# Altium footprint library LION.PcbLib: 90 footprints (part 4 of 13) (continued)
## CSG324 [mil] "CSG324" (continued)
via 31.49,314.95 diameter 18 hole 10
via 62.98,220.46 diameter 18 hole 10
via 31.49,220.46 diameter 18 hole 10
via -0.01,283.46 diameter 18 hole 10
via 31.49,188.97 diameter 18 hole 10
via 157.47,188.97 diameter 18 hole 10
via -251.96,-125.98 diameter 18 hole 10
via -220.46,-94.48 diameter 18 hole 10
via -283.46,-125.98 diameter 18 hole 10
via 220.46,125.98 diameter 18 hole 10
via 220.46,62.98 diameter 18 hole 10
via 220.46,220.46 diameter 18 hole 10
via 251.97,94.49 diameter 18 hole 10
via 94.49,251.97 diameter 18 hole 10
via 220.46,283.46 diameter 18 hole 10
via 188.97,283.46 diameter 18 hole 10
via 157.47,-125.98 diameter 18 hole 10
via 314.95,-220.46 diameter 18 hole 10
via -94.48,157.47 diameter 18 hole 10
via 220.46,-251.96 diameter 18 hole 10
via 62.98,-251.96 diameter 18 hole 10
via 31.49,-220.46 diameter 18 hole 10
via 62.98,-220.46 diameter 18 hole 10
via -220.46,-31.49 diameter 18 hole 10
via 125.98,-220.46 diameter 18 hole 10
via 157.47,-251.96 diameter 18 hole 10
via -283.47,-94.49 diameter 18 hole 10
via -283.46,-62.98 diameter 18 hole 10
via -62.98,188.97 diameter 18 hole 10
via -283.46,-31.49 diameter 18 hole 10
via -125.98,283.46 diameter 18 hole 10
via -94.48,220.46 diameter 18 hole 10
via 157.47,-220.46 diameter 18 hole 10
via 251.96,-157.47 diameter 18 hole 10
via 188.97,-188.97 diameter 18 hole 10
via 188.97,-157.47 diameter 18 hole 10
via 188.97,-283.46 diameter 18 hole 10
via 220.46,-220.46 diameter 18 hole 10
via 188.97,-220.46 diameter 18 hole 10
via 314.96,-251.97 diameter 18 hole 10
via 251.97,-283.47 diameter 18 hole 10
via 157.47,62.98 diameter 18 hole 10
via 94.48,220.46 diameter 18 hole 10
via -157.47,157.47 diameter 18 hole 10
via 188.97,125.98 diameter 18 hole 10
via -94.48,-188.97 diameter 18 hole 10
via 188.97,220.46 diameter 18 hole 10
via 62.98,251.96 diameter 18 hole 10
via 220.46,251.96 diameter 18 hole 10
via -94.48,188.97 diameter 18 hole 10
via -157.47,283.46 diameter 18 hole 10
via -125.98,251.96 diameter 18 hole 10
via -125.98,220.46 diameter 18 hole 10
via -125.98,157.47 diameter 18 hole 10
via -0.01,-188.97 diameter 18 hole 10
via 94.48,-220.46 diameter 18 hole 10
via 188.97,-251.96 diameter 18 hole 10
via 283.47,-283.47 diameter 18 hole 10
via -62.98,-157.47 diameter 18 hole 10
via 251.96,-62.98 diameter 18 hole 10
via 220.46,-157.47 diameter 18 hole 10
via 157.47,-31.49 diameter 18 hole 10
via 283.46,62.98 diameter 18 hole 10
via 188.97,94.48 diameter 18 hole 10
via 125.98,-125.98 diameter 18 hole 10
via 125.98,220.46 diameter 18 hole 10
via 220.46,188.97 diameter 18 hole 10
via 251.97,283.47 diameter 18 hole 10
via 31.49,251.96 diameter 18 hole 10
via 31.49,-251.96 diameter 18 hole 10
via -220.46,-283.46 diameter 18 hole 10
via -220.46,62.98 diameter 18 hole 10
via -94.48,62.98 diameter 18 hole 10
via -125.98,31.49 diameter 18 hole 10
via -0.01,31.49 diameter 18 hole 10
via -62.98,31.49 diameter 18 hole 10
via -94.48,-31.49 diameter 18 hole 10
via -251.96,-62.98 diameter 18 hole 10
via -157.47,-94.48 diameter 18 hole 10
via -283.46,-157.47 diameter 18 hole 10
via 31.49,-62.98 diameter 18 hole 10
via 31.49,-125.98 diameter 18 hole 10
via -0.01,-62.98 diameter 18 hole 10
via -62.98,-62.98 diameter 18 hole 10
via -62.98,-125.98 diameter 18 hole 10
via -94.49,-94.49 diameter 18 hole 10
via -94.48,-220.46 diameter 18 hole 10
via -188.97,-188.97 diameter 18 hole 10
via -0.01,62.98 diameter 18 hole 10
via -62.98,94.48 diameter 18 hole 10
via 157.47,-188.97 diameter 18 hole 10
via 94.48,-125.98 diameter 18 hole 10
via 62.98,62.98 diameter 18 hole 10
via 125.98,62.98 diameter 18 hole 10
via 94.48,31.49 diameter 18 hole 10
via 220.46,31.49 diameter 18 hole 10
via 62.98,-31.49 diameter 18 hole 10
via 94.48,-62.98 diameter 18 hole 10
via 188.97,-94.48 diameter 18 hole 10
via 283.46,-125.98 diameter 18 hole 10
via 251.96,-220.46 diameter 18 hole 10
via -188.97,157.47 diameter 18 hole 10
via -0.01,125.98 diameter 18 hole 10
via -62.98,157.47 diameter 18 hole 10
via -62.98,220.46 diameter 18 hole 10
via -94.48,125.98 diameter 18 hole 10
via -157.47,251.96 diameter 18 hole 10
via -251.97,283.47 diameter 18 hole 10
via -283.46,188.97 diameter 18 hole 10
via 251.96,125.98 diameter 18 hole 10
via 283.46,220.46 diameter 18 hole 10
via 157.47,157.47 diameter 18 hole 10
via 188.97,251.96 diameter 18 hole 10
via 94.49,283.47 diameter 18 hole 10
via 62.98,188.97 diameter 18 hole 10
via 62.98,125.98 diameter 18 hole 10
Top Layer:
  lines w5: -15.75,-267.72 -0.01,-283.46 ; -15.75,-236.22 -0.01,-251.96 ; 267.72,-236.22 299.21,-236.22 314.96,-251.97 ; 267.72,-204.72 299.21,-204.72 314.95,-220.46
  lines w6: -283.46,-220.46 -267.72,-204.72 ; -283.46,-188.97 -267.72,-173.23 ; -283.46,-125.98 -267.72,-110.24 ; -283.47,-94.49 -267.72,-78.74 ; -283.46,-62.98 -267.72,-47.24 ; -283.46,-31.49 -267.72,-15.75 ; -283.46,62.98 -267.72,47.24 ; -283.47,94.49 -267.72,78.74 ; -283.46,125.98 -267.72,110.24 ; -283.46,157.47 -267.72,141.73 ; -283.46,220.46 -267.72,204.72 ; -251.96,-188.97 -236.22,-173.23 ; -251.96,-125.98 -236.22,-110.24 ; -251.97,-94.49 -236.22,-78.74 ; -251.96,-31.49 -236.22,-15.75 ; -251.96,31.49 -236.22,15.75 ; -251.96,62.98 -236.22,47.24 ; -251.97,94.49 -236.22,78.74 ; -251.96,220.46 -236.22,204.72 ; -220.46,-220.46 -204.72,-204.72 ; -220.46,-188.97 -204.72,-173.23 ; -220.46,-94.48 -204.72,-78.74 ; -220.46,-31.49 -204.72,-15.75 ; -220.46,31.49 -204.72,15.75 ; -220.46,94.48 -204.72,78.74 ; -188.97,-125.98 -173.23,-110.24 ; -188.97,-94.48 -173.23,-78.74 ; -188.97,-62.98 -173.23,-47.24 ; -188.97,31.49 -173.23,15.75 ; -188.97,62.98 -173.23,47.24 ; -188.97,94.48 -173.23,78.74 ; -188.97,251.97 -188.97,251.98 -173.23,267.72 ; -157.47,-188.97 -141.73,-173.23 ; -157.47,-31.49 -141.73,-15.75 ; -157.47,62.98 -141.73,47.24 ; -157.47,157.47 -141.73,141.73 ; -157.47,283.46 -141.73,267.72 ; -125.98,-283.46 -110.24,-267.72 ; -125.98,-251.96 -110.24,-236.22 ; -125.98,-220.46 -110.24,-204.72 ; -125.98,-188.97 -110.24,-173.23 ; -125.98,-125.98 -110.24,-110.24 ; -125.98,-94.48 -110.24,-78.74 ; -125.98,62.98 -110.24,47.24 ; -125.98,94.48 -110.24,78.74 ; -125.98,125.98 -110.24,110.24 ; -125.98,157.47 -110.24,141.73 ; -125.98,220.46 -110.24,204.72 ; -125.98,251.96 -110.24,236.22 ; -125.98,283.46 -110.24,267.72 ; -94.49,-283.47 -78.74,-267.72 ; -94.49,-251.97 -78.74,-236.22 ; -94.48,-188.97 -78.74,-173.23 ; -94.48,-157.47 -78.74,-141.73 ; -94.48,157.47 -78.74,141.73 ; -94.48,188.97 -78.74,173.23 ; -94.48,220.46 -78.74,204.72 ; -94.49,251.97 -78.74,236.22 ; -62.98,-251.96 -47.24,-236.22 ; -62.98,-220.46 -47.24,-204.72 ; -62.98,-188.97 -47.24,-173.23 ; -62.98,188.97 -47.24,173.23 ; -15.75,-141.73 -0.01,-157.47 ; -15.75,-15.75 -0.01,-31.49 ; -15.75,141.73 -0.01,157.47 ; -15.75,173.23 -0.01,188.97 ; -15.75,204.72 -0.01,220.46 ; -15.75,267.72 -0.01,283.46 ; 15.75,-204.72 31.49,-220.46 ; 15.75,-141.73 31.49,-157.47 ; 15.75,-15.75 31.49,-31.49 ; 15.75,15.75 31.49,31.49 ; 15.75,110.24 31.49,125.98 ; 15.75,141.73 31.49,157.47 ; 15.75,173.23 31.49,188.97 ; 15.75,204.72 31.49,220.46 ; 15.75,267.72 31.49,283.46 31.49,314.95 ; 47.24,-236.22 62.98,-251.96 ; 47.24,-204.72 62.98,-220.46 ; 47.24,-141.73 62.98,-157.47 ; 47.24,78.74 62.98,94.48 ; 47.24,141.73 62.98,157.47 ; 47.24,204.72 62.98,220.46 ; 47.24,236.22 62.98,251.96 ; 47.24,267.72 62.98,283.46 ; 78.74,-141.73 94.48,-157.47 ; 78.74,141.73 94.48,157.47 ; 78.74,173.23 94.48,188.97 ; 78.74,204.72 94.48,220.46 ; 78.74,236.22 94.49,251.97 ; 110.24,-204.72 125.98,-220.46 ; 110.24,-141.73 125.98,-157.47 ; 110.24,-47.24 125.98,-62.98 ; 110.24,-15.75 125.98,-31.49 ; 110.24,15.75 125.98,31.49 ; 110.24,110.24 125.98,125.98 ; 110.24,141.73 125.98,157.47 ; 110.24,236.22 125.98,251.96 ; 110.24,267.72 125.98,283.46 ; 141.73,-236.22 157.47,-251.96 ; 141.73,-204.72 157.47,-220.46 ; 141.73,-141.73 157.47,-157.47 ; 141.73,-110.24 157.47,-125.98 ; 141.73,-78.74 157.47,-94.48 ; 141.73,-47.24 157.47,-62.98 ; 141.73,15.75 157.47,31.49 ; 141.73,47.24 157.47,62.98 ; 141.73,78.74 157.47,94.48 ; 141.73,110.24 157.47,125.98 ; 141.73,173.23 157.47,188.97 ; 141.73,204.72 157.47,220.46 ; 141.73,236.22 157.47,251.96 ; 173.23,-267.72 188.97,-283.46 ; 173.23,-204.72 188.97,-220.46 ; 173.23,-173.23 188.97,-188.97 ; 173.23,-141.73 188.97,-157.47 ; 173.23,-110.24 188.97,-125.98 ; 173.23,-15.75 188.97,-31.49 ; 173.23,15.75 188.97,31.49 ; 173.23,47.24 188.97,62.98 ; 173.23,110.24 188.97,125.98 ; 173.23,173.23 188.97,188.97 ; 173.23,204.72 188.97,220.46 ; 173.23,267.72 188.97,283.46 ; 204.72,-236.22 220.46,-251.96 ; 204.72,-204.72 220.46,-220.46 ; 204.72,-110.24 220.46,-125.98 ; 204.72,-78.74 220.46,-94.48 ; 204.72,47.24 220.46,62.98 ; 204.72,110.24 220.46,125.98 ; 204.72,141.73 220.46,157.47 ; 204.72,204.72 220.46,220.46 ; 204.72,236.22 220.46,251.96 ; 204.72,267.72 220.46,283.46 ; 236.22,-267.72 251.97,-283.47 ; 236.22,-141.73 251.96,-157.47 ; 236.22,-110.24 251.96,-125.98 ; 236.22,-78.74 251.97,-94.49 ; 236.22,-15.75 251.96,-31.49 ; 236.22,15.75 251.96,31.49 ; 236.22,47.24 251.96,62.98 ; 236.22,78.74 251.97,94.49 ; 236.22,141.73 251.96,157.47 ; 236.22,204.72 251.96,220.46 ; 236.22,236.22 251.97,251.97 ; 267.72,-141.73 283.46,-157.47 ; 267.72,-15.75 283.46,-31.49 ; 267.72,15.75 283.46,31.49 ; 267.72,78.74 283.47,94.49 ; 267.72,110.24 283.46,125.98 ; 267.72,141.73 283.46,157.47 ; 267.72,173.23 283.46,188.97
  lines w12: -94.48,-125.98 -78.74,-110.24 ; -94.48,-62.98 -78.74,-47.24 ; -94.48,31.49 -78.74,15.75 ; -94.49,94.49 -78.74,78.74 ; -62.98,-94.48 -47.24,-78.74 ; -62.98,-31.49 -47.24,-15.75 ; -62.98,62.98 -47.24,47.24 ; -62.98,125.98 -47.24,110.24 ; -15.75,-110.24 -0.01,-125.98 ; -15.75,78.74 -0.01,94.48 ; 15.75,-78.74 31.49,-94.48 ; 47.24,-110.24 62.98,-125.98 ; 47.24,-47.24 62.98,-62.98 ; 110.24,-110.24 125.98,-125.98
  lines w15: -283.46,-157.47 -267.72,-141.73 ; -283.46,188.97 -267.72,173.23 ; -251.96,-62.98 -236.22,-47.24 ; -251.97,283.47 -236.22,267.72 ; -220.46,-283.46 -204.72,-267.72 ; -220.46,62.98 -204.72,47.24 ; -188.97,-188.97 -173.23,-173.23 ; -188.97,157.47 -173.23,141.73 ; -157.47,-94.48 -141.73,-78.74 ; -157.47,251.96 -141.73,236.22 ; -125.98,31.49 -110.24,15.75 ; -94.48,-220.46 -78.74,-204.72 ; -94.49,-94.49 -78.74,-78.74 ; -94.48,-31.49 -78.74,-15.75 ; -94.48,62.98 -78.74,47.24 ; -94.48,125.98 -78.74,110.24 ; -62.98,-157.47 -47.24,-141.73 ; -62.98,-125.98 -47.24,-110.24 ; -62.98,-62.98 -47.24,-47.24 ; -62.98,31.49 -47.24,15.75 ; -62.98,94.48 -47.24,78.74 ; -62.98,157.47 -47.24,141.73 ; -62.98,220.46 -47.24,204.72 ; -15.75,-173.23 -0.01,-188.97 ; -15.75,-47.24 -0.01,-62.98 ; -15.75,15.75 -0.01,31.49 ; -15.75,47.24 -0.01,62.98 ; -15.75,110.24 -0.01,125.98 ; 15.75,-236.22 31.49,-251.96 ; 15.75,-47.24 31.49,-62.98 ; 15.75,236.22 31.49,251.96 ; 47.24,-15.75 62.98,-31.49 ; 47.24,47.24 62.98,62.98 ; 47.24,110.24 62.98,125.98 ; 47.24,173.23 62.98,188.97 ; 78.74,-204.72 94.48,-220.46 ; 78.74,-110.24 94.48,-125.98 ; 78.74,-47.24 94.48,-62.98 ; 78.74,15.75 94.48,31.49 ; 78.74,267.72 94.49,283.47 ; 110.24,-267.72 110.24,-294.81 125.98,-310.55 125.98,-322.83 ; 110.24,47.24 125.98,62.98 ; 110.24,204.72 125.98,220.46 ; 141.73,-173.23 157.47,-188.97 ; 141.73,-15.75 157.47,-31.49 ; 141.73,141.73 157.47,157.47 ; 173.23,-236.22 188.97,-251.96 ; 173.23,-78.74 188.97,-94.48 ; 173.23,78.74 188.97,94.48 ; 173.23,236.22 188.97,251.96 ; 204.72,-141.73 220.46,-157.47 ; 204.72,15.75 220.46,31.49 ; 204.72,173.23 220.46,188.97 ; 236.22,-204.72 251.96,-220.46 ; 236.22,-47.24 251.96,-62.98 ; 236.22,110.24 251.96,125.98 ; 236.22,267.72 251.97,283.47 ; 267.72,-267.72 283.47,-283.47 ; 267.72,-110.24 283.46,-125.98 ; 267.72,47.24 283.46,62.98 ; 267.72,204.72 283.46,220.46
Top Overlay:
  lines w1: -320,280 ccw(c-310,280) -310,270 ccw(c-310,280) -300,280 ccw(c-310,280) -310,290 ccw(c-310,280) -320,280 ; -295.28,-295.28 295.28,-295.28 295.28,295.28 -295.28,295.28 -295.28,-295.28
Mechanical 5:
  lines w1: -320,280 cw(c-310,280) -310,290 cw(c-310,280) -300,280 cw(c-310,280) -310,270 cw(c-310,280) -320,280 ; -295.28,-295.28 295.28,-295.28 295.28,295.28 -295.28,295.28 -295.28,-295.28
Mechanical 14:
  text "B14" at 81.73,236.22 h25
  text "G13" at 50.24,78.74 h25
  text "C14" at 81.73,204.72 h25
  text "R12" at 18.74,-173.23 h25
  text "T2" at -276.22,-204.72 h25
  text "U5" at -181.73,-236.22 h25
  text "G5" at -181.73,78.74 h25
  text "J1" at -307.72,15.75 h25
  text "K4" at -213.23,-15.75 h25
  text "N3" at -244.72,-110.24 h25
  text "P6" at -150.24,-141.73 h25
  text "F2" at -276.22,110.24 h25
  text "C3" at -244.72,204.72 h25
  text "D6" at -150.24,173.23 h25
  text "M12" at 18.74,-78.74 h25
  text "V8" at -87.24,-267.72 h25
  text "H10" at -44.25,47.24 h25
  text "H12" at 18.74,47.24 h25
  text "K12" at 18.74,-15.75 h25
  text "F12" at 18.74,110.24 h25
  text "A7" at -118.74,267.72 h25
  text "R18" at 207.72,-173.23 h25
  text "R13" at 50.24,-173.23 h25
  text "M13" at 50.24,-78.74 h25
  text "A14" at 81.73,267.72 h25
  text "B18" at 207.72,236.22 h25
  text "B7" at -118.74,236.22 h25
  text "A4" at -213.23,267.72 h25
  text "K10" at -44.25,-15.75 h25
  text "J10" at -44.25,15.75 h25
  text "P9" at -55.75,-141.73 h25
  text "P7" at -118.74,-141.73 h25
  text "C1" at -307.72,204.72 h25
  text "E1" at -307.72,141.73 h25
  text "R2" at -276.22,-173.23 h25
  text "R5" at -181.73,-173.23 h25
  text "R1" at -307.72,-173.23 h25
  text "T6" at -150.24,-204.72 h25
  text "K9" at -55.75,-15.75 h25
  text "G1" at -307.72,78.74 h25
  text "G6" at -150.24,78.74 h25
  text "J2" at -276.22,15.75 h25
  text "R3" at -244.72,-173.23 h25
  text "V9" at -55.75,-267.72 h25
  text "H5" at -181.73,47.24 h25
  text "R6" at -150.24,-173.23 h25
  text "F6" at -150.24,110.24 h25
  text "N6" at -150.24,-110.24 h25
  text "C9" at -55.75,204.72 h25
  text "J3" at -244.72,15.75 h25
  text "U7" at -118.74,-236.22 h25
  text "H1" at -307.72,47.24 h25
  text "E9" at -55.75,141.73 h25
  text "G2" at -276.22,78.74 h25
  text "M14" at 81.73,-78.74 h25
  text "F1" at -307.72,110.24 h25
  text "L14" at 81.73,-47.24 h25
  text "N4" at -213.23,-110.24 h25
  text "K18" at 207.72,-15.75 h25
  text "K17" at 176.22,-15.75 h25
  text "L13" at 50.24,-47.24 h25
  text "P11" at -12.76,-141.73 h25
  text "G3" at -244.72,78.74 h25
  text "P13" at 50.24,-141.73 h25
  text "T8" at -87.24,-204.72 h25
  text "P12" at 18.74,-141.73 h25
  text "R8" at -87.24,-173.23 h25
  text "E12" at 18.74,141.73 h25
  text "V7" at -118.74,-267.72 h25
  text "E11" at -12.76,141.73 h25
  text "G4" at -213.23,78.74 h25
  text "E13" at 50.24,141.73 h25
  text "U6" at -150.24,-236.22 h25
  text "E10" at -44.25,141.73 h25
  text "U8" at -87.24,-236.22 h25
  text "B9" at -55.75,236.22 h25
  text "H6" at -150.24,47.24 h25
  text "M4" at -213.23,-78.74 h25
  text "T3" at -244.72,-204.72 h25
  text "M6" at -150.24,-78.74 h25
  text "C2" at -276.22,204.72 h25
  text "J4" at -213.23,15.75 h25
  text "U9" at -55.75,-236.22 h25
  text "H2" at -276.22,47.24 h25
  text "V6" at -150.24,-267.72 h25
  text "H4" at -213.23,47.24 h25
  text "T1" at -307.72,-204.72 h25
  text "D9" at -55.75,173.23 h25
  text "K2" at -276.22,-15.75 h25
  text "G11" at -12.76,78.74 h25
  text "F10" at -44.25,110.24 h25
  text "P10" at -44.25,-141.73 h25
  text "J14" at 81.73,15.75 h25
  text "B17" at 176.22,236.22 h25
  text "K15" at 113.23,-15.75 h25
  text "E18" at 207.72,141.73 h25
  text "K13" at 50.24,-15.75 h25
  text "J13" at 50.24,15.75 h25
  text "E16" at 144.72,141.73 h25
  text "F18" at 207.72,110.24 h25
  text "D15" at 113.23,173.23 h25
  text "J17" at 176.22,15.75 h25
  text "C17" at 176.22,204.72 h25
  text "D18" at 207.72,173.23 h25
  text "E17" at 176.22,141.73 h25
  text "J15" at 113.23,15.75 h25
  text "H17" at 176.22,47.24 h25
  text "J18" at 207.72,15.75 h25
  text "H15" at 113.23,47.24 h25
  text "B13" at 50.24,236.22 h25
  text "G18" at 207.72,78.74 h25
  text "G14" at 81.73,78.74 h25
  text "K5" at -181.73,-15.75 h25
  text "D12" at 18.74,173.23 h25
  text "N16" at 144.72,-110.24 h25
  text "N15" at 113.23,-110.24 h25
  text "M17" at 176.22,-78.74 h25
  text "M16" at 144.72,-78.74 h25
  text "P18" at 207.72,-141.73 h25
  text "N17" at 176.22,-110.24 h25
  text "P14" at 81.73,-141.73 h25
  text "F13" at 50.24,110.24 h25
  text "A13" at 50.24,267.72 h25
  text "F14" at 81.73,110.24 h25
  text "A11" at -12.76,267.72 h25
  text "L4" at -213.23,-47.24 h25
  text "M2" at -276.22,-78.74 h25
  text "A10" at -44.25,267.72 h25
  text "C11" at -12.76,204.72 h25
  text "C10" at -44.25,204.72 h25
  text "A9" at -55.75,267.72 h25
  text "D10" at -44.25,173.23 h25
  text "D14" at 81.73,173.23 h25
  text "N2" at -276.22,-110.24 h25
  text "M3" at -244.72,-78.74 h25
  text "N1" at -307.72,-110.24 h25
  text "A8" at -87.24,267.72 h25
  text "F16" at 144.72,110.24 h25
  text "H16" at 144.72,47.24 h25
  text "C16" at 144.72,204.72 h25
  text "G17" at 176.22,78.74 h25
  text "B12" at 18.74,236.22 h25
  text "A16" at 144.72,267.72 h25
  text "A15" at 113.23,267.72 h25
  text "N14" at 81.73,-110.24 h25
  text "T18" at 207.72,-204.72 h25
  text "E7" at -118.74,141.73 h25
  text "U16" at 144.72,-236.22 h25
  text "U11" at -12.76,-236.22 h25
  text "T10" at -44.25,-204.72 h25
  text "T11" at -12.76,-204.72 h25
  text "U13" at 50.24,-236.22 h25
  text "K3" at -244.72,-15.75 h25
  text "T13" at 50.24,-204.72 h25
  text "V14" at 81.73,-267.72 h25
  text "U14" at 81.73,-236.22 h25
  text "M1" at -307.72,-78.74 h25
  text "L1" at -307.72,-47.24 h25
  text "D8" at -87.24,173.23 h25
  text "K1" at -307.72,-15.75 h25
  text "A6" at -150.24,267.72 h25
  text "C7" at -118.74,204.72 h25
  text "T14" at 81.73,-204.72 h25
  text "P17" at 176.22,-141.73 h25
  text "R15" at 113.23,-173.23 h25
  text "P15" at 113.23,-141.73 h25
  text "V15" at 113.23,-267.72 h25
  text "T16" at 144.72,-204.72 h25
  text "T15" at 113.23,-204.72 h25
  text "U18" at 207.72,-236.22 h25
  text "U17" at 176.22,-236.22 h25
  text "R17" at 176.22,-173.23 h25
  text "V16" at 144.72,-267.72 h25
  text "R16" at 144.72,-173.23 h25
  text "V17" at 176.22,-267.72 h25
  text "U12" at 18.74,-236.22 h25
  text "V12" at 18.74,-267.72 h25
  text "T9" at -55.75,-204.72 h25
  text "V10" at -44.25,-267.72 h25
  text "M18" at 207.72,-78.74 h25
  text "V11" at -12.76,-267.72 h25
  text "L18" at 207.72,-47.24 h25
  text "L16" at 144.72,-47.24 h25
  text "L15" at 113.23,-47.24 h25
  text "A3" at -244.72,267.72 h25
  text "H14" at 81.73,47.24 h25
  text "C12" at 18.74,204.72 h25
  text "E5" at -181.73,141.73 h25
  text "F15" at 113.23,110.24 h25
  text "R7" at -118.74,-173.23 h25
  text "C15" at 113.23,204.72 h25
  text "B11" at -12.76,236.22 h25
  text "B16" at 144.72,236.22 h25
  text "D7" at -118.74,173.23 h25
  text "M10" at -44.25,-78.74 h25
  text "N11" at -12.76,-110.24 h25
  text "L11" at -12.76,-47.24 h25
  text "N9" at -55.75,-110.24 h25
  text "M8" at -87.24,-78.74 h25
  text "N7" at -118.74,-110.24 h25
  text "L7" at -118.74,-47.24 h25
  text "K8" at -87.24,-15.75 h25
  text "J7" at -118.74,15.75 h25
  text "H8" at -87.24,47.24 h25
  text "G7" at -118.74,78.74 h25
  text "G9" at -55.75,78.74 h25
  text "F8" at -87.24,110.24 h25
  text "J11" at -12.76,15.75 h25
  text "A5" at -181.73,267.72 h25
  text "B6" at -150.24,236.22 h25
  text "C6" at -150.24,204.72 h25
  text "E15" at 113.23,141.73 h25
  text "E6" at -150.24,141.73 h25
  text "R9" at -55.75,-173.23 h25
  text "T12" at 18.74,-204.72 h25
  text "U15" at 113.23,-236.22 h25
  text "V18" at 207.72,-267.72 h25
  text "P8" at -87.24,-141.73 h25
  text "L17" at 176.22,-47.24 h25
  text "P16" at 144.72,-141.73 h25
  text "K14" at 81.73,-15.75 h25
  text "H18" at 207.72,47.24 h25
  text "G15" at 113.23,78.74 h25
  text "N13" at 50.24,-110.24 h25
  text "C13" at 50.24,204.72 h25
  text "D16" at 144.72,173.23 h25
  text "A17" at 176.22,267.72 h25
  text "B10" at -44.25,236.22 h25
  text "U10" at -44.25,-236.22 h25
  text "V3" at -244.72,-267.72 h25
  text "V13" at 50.24,-267.72 h25
  text "H3" at -244.72,47.24 h25
  text "H7" at -118.74,47.24 h25
  text "J6" at -150.24,15.75 h25
  text "J9" at -55.75,15.75 h25
  text "J8" at -87.24,15.75 h25
  text "K7" at -118.74,-15.75 h25
  text "L2" at -276.22,-47.24 h25
  text "M5" at -181.73,-78.74 h25
  text "P1" at -307.72,-141.73 h25
  text "L10" at -44.25,-47.24 h25
  text "M11" at -12.76,-78.74 h25
  text "N10" at -44.25,-110.24 h25
  text "L9" at -55.75,-47.24 h25
  text "M9" at -55.75,-78.74 h25
  text "L8" at -87.24,-47.24 h25
  text "N8" at -87.24,-110.24 h25
  text "M7" at -118.74,-78.74 h25
  text "T7" at -118.74,-204.72 h25
  text "R4" at -213.23,-173.23 h25
  text "G10" at -44.25,78.74 h25
  text "H9" at -55.75,47.24 h25
  text "G8" at -87.24,78.74 h25
  text "R14" at 81.73,-173.23 h25
  text "N12" at 18.74,-110.24 h25
  text "G12" at 18.74,78.74 h25
  text "H11" at -12.76,47.24 h25
  text "H13" at 50.24,47.24 h25
  text "J12" at 18.74,15.75 h25
  text "J16" at 144.72,15.75 h25
  text "K11" at -12.76,-15.75 h25
  text "L12" at 18.74,-47.24 h25
  text "M15" at 113.23,-78.74 h25
  text "N18" at 207.72,-110.24 h25
  text "T17" at 176.22,-204.72 h25
  text "E4" at -213.23,141.73 h25
  text "F9" at -55.75,110.24 h25
  text "E8" at -87.24,141.73 h25
  text "C8" at -87.24,204.72 h25
  text "F7" at -118.74,110.24 h25
  text "B5" at -181.73,236.22 h25
  text "A2" at -276.22,267.72 h25
  text "D1" at -307.72,173.23 h25
  text "F17" at 176.22,110.24 h25
  text "C18" at 207.72,204.72 h25
  text "E14" at 81.73,141.73 h25
  text "B15" at 113.23,236.22 h25
  text "A12" at 18.74,267.72 h25
  text "D11" at -12.76,173.23 h25
  text "F11" at -12.76,110.24 h25
  text "B1" at -307.72,236.22 h25
  text "A1" at -307.72,267.72 h25
  text "C4" at -213.23,204.72 h25
  text "B4" at -213.23,236.22 h25
  text "C5" at -181.73,204.72 h25
  text "E2" at -276.22,141.73 h25
  text "D2" at -276.22,173.23 h25
  text "F4" at -213.23,110.24 h25
  text "F3" at -244.72,110.24 h25
  text "E3" at -244.72,141.73 h25
  text "D3" at -244.72,173.23 h25
  text "D5" at -181.73,173.23 h25
  text "D4" at -213.23,173.23 h25
  text "B3" at -244.72,236.22 h25
  text "B2" at -276.22,236.22 h25
  text "J5" at -181.73,15.75 h25
  text "F5" at -181.73,110.24 h25
  text "U2" at -276.22,-236.22 h25
  text "V2" at -276.22,-267.72 h25
  text "U4" at -213.23,-236.22 h25
  text "U3" at -244.72,-236.22 h25
  text "U1" at -307.72,-236.22 h25
  text "V1" at -307.72,-267.72 h25
  text "L6" at -150.24,-47.24 h25
  text "L5" at -181.73,-47.24 h25
  text "L3" at -244.72,-47.24 h25
  text "P2" at -276.22,-141.73 h25
  text "P4" at -213.23,-141.73 h25
  text "P3" at -244.72,-141.73 h25
  text "N5" at -181.73,-110.24 h25
  text "P5" at -181.73,-141.73 h25
  text "T5" at -181.73,-204.72 h25
  text "T4" at -213.23,-204.72 h25
  text "V5" at -181.73,-267.72 h25
  text "V4" at -213.23,-267.72 h25
  text "K6" at -150.24,-15.75 h25
  text "B8" at -87.24,236.22 h25
  text "D13" at 50.24,173.23 h25
  text "D17" at 176.22,173.23 h25
  text "G16" at 144.72,78.74 h25
  text "A18" at 207.72,267.72 h25
  text "K16" at 144.72,-15.75 h25
  text "R10" at -44.25,-173.23 h25
  text "R11" at -12.76,-173.23 h25
Mechanical 16:
  lines w1: 295.28,-295.28 -320,-295.28 -320,295.28 295.28,295.28 ; 295.28,-295.28 295.28,295.28 ; 295.28,-295.28 -295.28,-295.28 -295.28,295.28 295.28,295.28 ; 295.28,-295.28 295.28,295.28 ; -320,280 ccw(c-310,280) -310,270 ccw(c-310,280) -300,280 ccw(c-310,280) -310,290 ccw(c-310,280) -320,280

## CVPD-922 [mil] "CVPD-922"
pads (6):
  rect 90.6x47.2 smd: 1(-155.51,100) 2(-155.51,0) 3(-155.51,-100) 4(155.51,-100) 5(155.51,0) 6(155.51,100)
Top Overlay:
  circle w19.69: c-139.76,240.16 r9.85
  circle w9.84: c-204.72,147.24 r4.92
  lines w7.87: -179.13,-137.8 -179.13,-279.53 179.13,-279.53 179.13,-137.8 ; -179.13,-62.6 -179.13,-38.98 ; -179.13,37.4 -179.13,61.02 ; -179.13,137.8 -179.13,279.53 179.13,279.53 179.13,137.8 ; 179.13,-62.6 179.13,-38.98 ; 179.13,37.4 179.13,61.02
  text ".Designator" at -244.96,39.84 h25
Mechanical 5:
  circle w9.84: c-204.72,147.24 r4.92
  circle w19.69: c-139.76,240.16 r9.85
  lines w7.87: -179.13,-137.8 -179.13,-279.53 179.13,-279.53 179.13,-137.8 ; -179.13,-62.6 -179.13,-38.98 ; -179.13,37.4 -179.13,61.02 ; -179.13,137.8 -179.13,279.53 179.13,279.53 179.13,137.8 ; 179.13,-62.6 179.13,-38.98 ; 179.13,37.4 179.13,61.02
  text "CVHD-950_CVPD-922_CVHD-950X-100" at 0,649.53 h50
  text "U114" at 0,105 h50
Mechanical 14:
  text "4" at 155.51,-90 h25
  text "5" at 155.51,10 h25
  text "3" at -155.51,-90 h25
  text "1" at -155.51,110 h25
  text "6" at 155.51,110 h25
  text "2" at -155.51,10 h25
Mechanical 16:
  circle w3.94: c-140.55,240.16 r19.68
  circle w1.97: c0,0 r13.78
  pour cut-out: -210.63,-289.37 -210.63,289.37 210.63,289.37 210.63,-289.37
  region: -210.63,-289.37 -210.63,289.37 210.63,289.37 210.63,-289.37
  lines w1.97: -19.69,0 19.69,0 ; 0,-19.69 0,19.69
  lines w3.94: -179.92,-279.53 -179.92,279.53 179.92,279.53 179.92,-279.53 -179.92,-279.53
Mechanical 17:
  text "CVHD-950X-100.000" at -50,0 h25
3D body: height 150, standoff 0, extent -210.63,-289.37 210.63,289.37

## CY5032-4P [mm] "CY5032-4P"
pads (4):
  rect 1.2x2 smd rot 90.02: 1(-1.85,-1.1) 2(1.85,-1.1) 3(1.85,1.1) 4(-1.85,1.1)
Top Overlay:
  circle w0.2: c-1.772,-2.26 r0.2
  lines w0.15: -2.5,-0.4 -2.5,0.4 ; -2.5,-0.1 -0.45,-0.1 -0.45,-1.55 ; -0.7,-1.6 0.7,-1.6 ; -0.7,1.6 0.7,1.6 ; 2.5,-0.4 2.5,0.4
Mechanical 5:
  circle w0.2: c-1.772,-2.26 r0.2
  lines w0.15: -2.5,-0.4 -2.5,0.4 ; -2.5,-0.1 -0.45,-0.1 -0.45,-1.55 ; -0.7,-1.6 0.7,-1.6 ; -0.7,1.6 0.7,1.6 ; 2.5,-0.4 2.5,0.4
  text "Y11" at 0.289,1.8 h0.64
Mechanical 14:
  text "4" at -2.658,1.05 h0.64
  text "2" at 1.092,-1.2 h0.64
  text "1" at -2.558,-1.2 h0.64
  text "3" at 1.042,0.95 h0.64
Mechanical 16:
  region: -2.9,1.75 -2.9,-1.75 2.9,-1.75 2.9,1.75
  lines w0.025: -1.6,-1.25 -1.6,1.25 1.6,1.25 1.6,-1.25 -1.6,-1.25
Mechanical 17:
  text "X503225MSB4SI" at -0.45,1.9 h0.64
3D body: height 3.81, standoff 0, extent -2.9,-1.75 2.9,1.75